# Altium schematic symbol library jlcpcb_2025_04_capacitors_extended_0805.schlib: 3281 symbols (part 5 of 18) (continued)
## AC0805KRX7R7BB104
designator C?  Capacitance: 100nF  (hidden comment: *)
Capacitor, Ceramic (MLCC), 100nF, ±10%, 16V, X7R, ±10%, SMD 0805; Manufacturer: YAGEO; Manufacturer Part Number: AC0805KRX7R7BB104; Package Size: 0805; JLCPCB Basic Part: No; JLCPCB Part Number: C2169363; Supplier 1: LCSC; Category: Capacitors - MLCC; Supplier Part Number 1: C2169363; Tolerance: ±10%; Voltage Rating: 16V; Temperature Coefficient: X7R; RoHS: Yes; ComponentLink1Description: Datasheet; ComponentLink1URL: https://wmsc.lcsc.com/wmsc/upload/file/pdf/v2/lcsc/2202040330_YAGEO-AC0805KRX7R7BB104_C2169363.pdf; ComponentLink2Description: JLCPCB Part URL; ComponentLink2URL: https://jlcpcb.com/partdetail/C2169363; ComponentLink3Description: LCSC Part URL; ComponentLink3URL: https://lcsc.com/product-detail/Multilayer-Ceramic-Capacitors-MLCC---SMD-SMT_YAGEO-YAGEO-AC0805KRX7R7BB104_C2169363.html
footprint CAP-0805 (0805 (2012M) Capacitor)
pins: 1, 2

## AC0805KRX7R7BB224
designator C?  Capacitance: 220nF  (hidden comment: *)
Capacitor, Ceramic (MLCC), 220nF, ±10%, 16V, X7R, ±10%, SMD 0805; Manufacturer: YAGEO; Manufacturer Part Number: AC0805KRX7R7BB224; Package Size: 0805; JLCPCB Basic Part: No; JLCPCB Part Number: C2173339; Supplier 1: LCSC; Category: Capacitors - MLCC; Supplier Part Number 1: C2173339; Tolerance: ±10%; Voltage Rating: 16V; Temperature Coefficient: X7R; RoHS: Yes; ComponentLink1Description: Datasheet; ComponentLink1URL: https://wmsc.lcsc.com/wmsc/upload/file/pdf/v2/lcsc/2202040630_YAGEO-AC0805KRX7R7BB224_C2173339.pdf; ComponentLink2Description: JLCPCB Part URL; ComponentLink2URL: https://jlcpcb.com/partdetail/C2173339; ComponentLink3Description: LCSC Part URL; ComponentLink3URL: https://lcsc.com/product-detail/Multilayer-Ceramic-Capacitors-MLCC---SMD-SMT_YAGEO-YAGEO-AC0805KRX7R7BB224_C2173339.html
footprint CAP-0805 (0805 (2012M) Capacitor)
pins: 1, 2

## AC0805KRX7R8BB102
designator C?  Capacitance: 1nF  (hidden comment: *)
Capacitor, Ceramic (MLCC), 1nF, ±10%, 25V, X7R, ±10%, SMD 0805; Manufacturer: YAGEO; Manufacturer Part Number: AC0805KRX7R8BB102; Package Size: 0805; JLCPCB Basic Part: No; JLCPCB Part Number: C2169184; Supplier 1: LCSC; Category: Capacitors - MLCC; Supplier Part Number 1: C2169184; Tolerance: ±10%; Voltage Rating: 25V; Temperature Coefficient: X7R; RoHS: Yes; ComponentLink1Description: Datasheet; ComponentLink1URL: https://wmsc.lcsc.com/wmsc/upload/file/pdf/v2/lcsc/2202040330_YAGEO-AC0805KRX7R8BB102_C2169184.pdf; ComponentLink2Description: JLCPCB Part URL; ComponentLink2URL: https://jlcpcb.com/partdetail/C2169184; ComponentLink3Description: LCSC Part URL; ComponentLink3URL: https://lcsc.com/product-detail/Multilayer-Ceramic-Capacitors-MLCC---SMD-SMT_YAGEO-YAGEO-AC0805KRX7R8BB102_C2169184.html
footprint CAP-0805 (0805 (2012M) Capacitor)
pins: 1, 2

## AC0805KRX7R8BB103
designator C?  Capacitance: 10nF  (hidden comment: *)
Capacitor, Ceramic (MLCC), 10nF, ±10%, 25V, X7R, ±10%, SMD 0805; Manufacturer: YAGEO; Manufacturer Part Number: AC0805KRX7R8BB103; Package Size: 0805; JLCPCB Basic Part: No; JLCPCB Part Number: C2169189; Supplier 1: LCSC; Category: Capacitors - MLCC; Supplier Part Number 1: C2169189; Tolerance: ±10%; Voltage Rating: 25V; Temperature Coefficient: X7R; RoHS: Yes; ComponentLink1Description: Datasheet; ComponentLink1URL: https://wmsc.lcsc.com/wmsc/upload/file/pdf/v2/lcsc/2202040330_YAGEO-AC0805KRX7R8BB103_C2169189.pdf; ComponentLink2Description: JLCPCB Part URL; ComponentLink2URL: https://jlcpcb.com/partdetail/C2169189; ComponentLink3Description: LCSC Part URL; ComponentLink3URL: https://lcsc.com/product-detail/Multilayer-Ceramic-Capacitors-MLCC---SMD-SMT_YAGEO-YAGEO-AC0805KRX7R8BB103_C2169189.html
footprint CAP-0805 (0805 (2012M) Capacitor)
pins: 1, 2

## AC0805KRX7R8BB104
designator C?  Capacitance: 100nF  (hidden comment: *)
Capacitor, Ceramic (MLCC), 100nF, ±10%, 25V, X7R, ±10%, SMD 0805; Manufacturer: YAGEO; Manufacturer Part Number: AC0805KRX7R8BB104; Package Size: 0805; JLCPCB Basic Part: No; JLCPCB Part Number: C726591; Supplier 1: LCSC; Category: Capacitors - MLCC; Supplier Part Number 1: C726591; Tolerance: ±10%; Voltage Rating: 25V; Temperature Coefficient: X7R; RoHS: Yes; ComponentLink1Description: Datasheet; ComponentLink1URL: https://wmsc.lcsc.com/wmsc/upload/file/pdf/v2/lcsc/2304140030_YAGEO-AC0805KRX7R8BB104_C726591.pdf; ComponentLink2Description: JLCPCB Part URL; ComponentLink2URL: https://jlcpcb.com/partdetail/C726591; ComponentLink3Description: LCSC Part URL; ComponentLink3URL: https://lcsc.com/product-detail/Multilayer-Ceramic-Capacitors-MLCC---SMD-SMT_YAGEO-YAGEO-AC0805KRX7R8BB104_C726591.html
footprint CAP-0805 (0805 (2012M) Capacitor)
pins: 1, 2

## AC0805KRX7R8BB224
designator C?  Capacitance: 220nF  (hidden comment: *)
Capacitor, Ceramic (MLCC), 220nF, ±10%, 25V, X7R, ±10%, SMD 0805; Manufacturer: YAGEO; Manufacturer Part Number: AC0805KRX7R8BB224; Package Size: 0805; JLCPCB Basic Part: No; JLCPCB Part Number: C2181254; Supplier 1: LCSC; Category: Capacitors - MLCC; Supplier Part Number 1: C2181254; Tolerance: ±10%; Voltage Rating: 25V; Temperature Coefficient: X7R; RoHS: Yes; ComponentLink1Description: Datasheet; ComponentLink1URL: https://wmsc.lcsc.com/wmsc/upload/file/pdf/v2/lcsc/2202041200_YAGEO-AC0805KRX7R8BB224_C2181254.pdf; ComponentLink2Description: JLCPCB Part URL; ComponentLink2URL: https://jlcpcb.com/partdetail/C2181254; ComponentLink3Description: LCSC Part URL; ComponentLink3URL: https://lcsc.com/product-detail/Multilayer-Ceramic-Capacitors-MLCC---SMD-SMT_YAGEO-YAGEO-AC0805KRX7R8BB224_C2181254.html
footprint CAP-0805 (0805 (2012M) Capacitor)
pins: 1, 2

## AC0805KRX7R9BB102
designator C?  Capacitance: 1nF  (hidden comment: *)
Capacitor, Ceramic (MLCC), 1nF, ±10%, 50V, X7R, ±10%, SMD 0805; Manufacturer: YAGEO; Manufacturer Part Number: AC0805KRX7R9BB102; Package Size: 0805; JLCPCB Basic Part: No; JLCPCB Part Number: C726592; Supplier 1: LCSC; Category: Capacitors - MLCC; Supplier Part Number 1: C726592; Tolerance: ±10%; Voltage Rating: 50V; Temperature Coefficient: X7R; RoHS: Yes; ComponentLink1Description: Datasheet; ComponentLink1URL: https://wmsc.lcsc.com/wmsc/upload/file/pdf/v2/lcsc/2304140030_YAGEO-AC0805KRX7R9BB102_C726592.pdf; ComponentLink2Description: JLCPCB Part URL; ComponentLink2URL: https://jlcpcb.com/partdetail/C726592; ComponentLink3Description: LCSC Part URL; ComponentLink3URL: https://lcsc.com/product-detail/Multilayer-Ceramic-Capacitors-MLCC---SMD-SMT_YAGEO-YAGEO-AC0805KRX7R9BB102_C726592.html
footprint CAP-0805 (0805 (2012M) Capacitor)
pins: 1, 2

## AC0805KRX7R9BB103
designator C?  Capacitance: 10nF  (hidden comment: *)
Capacitor, Ceramic (MLCC), 10nF, ±10%, 50V, X7R, ±10%, SMD 0805; Manufacturer: YAGEO; Manufacturer Part Number: AC0805KRX7R9BB103; Package Size: 0805; JLCPCB Basic Part: No; JLCPCB Part Number: C326835; Supplier 1: LCSC; Category: Capacitors - MLCC; Supplier Part Number 1: C326835; Tolerance: ±10%; Voltage Rating: 50V; Temperature Coefficient: X7R; RoHS: Yes; ComponentLink1Description: Datasheet; ComponentLink1URL: https://wmsc.lcsc.com/wmsc/upload/file/pdf/v2/lcsc/1811141226_YAGEO-AC0805KRX7R9BB103_C326835.pdf; ComponentLink2Description: JLCPCB Part URL; ComponentLink2URL: https://jlcpcb.com/partdetail/C326835; ComponentLink3Description: LCSC Part URL; ComponentLink3URL: https://lcsc.com/product-detail/Multilayer-Ceramic-Capacitors-MLCC---SMD-SMT_YAGEO-YAGEO-AC0805KRX7R9BB103_C326835.html
footprint CAP-0805 (0805 (2012M) Capacitor)
pins: 1, 2

## AC0805KRX7R9BB104
designator C?  Capacitance: 100nF  (hidden comment: *)
Capacitor, Ceramic (MLCC), 100nF, ±10%, 50V, X7R, ±10%, SMD 0805; Manufacturer: YAGEO; Manufacturer Part Number: AC0805KRX7R9BB104; Package Size: 0805; JLCPCB Basic Part: No; JLCPCB Part Number: C277502; Supplier 1: LCSC; Category: Capacitors - MLCC; Supplier Part Number 1: C277502; Tolerance: ±10%; Voltage Rating: 50V; Temperature Coefficient: X7R; RoHS: Yes; ComponentLink1Description: Datasheet; ComponentLink1URL: https://wmsc.lcsc.com/wmsc/upload/file/pdf/v2/lcsc/2304140030_YAGEO-AC0805KRX7R9BB104_C277502.pdf; ComponentLink2Description: JLCPCB Part URL; ComponentLink2URL: https://jlcpcb.com/partdetail/C277502; ComponentLink3Description: LCSC Part URL; ComponentLink3URL: https://lcsc.com/product-detail/Multilayer-Ceramic-Capacitors-MLCC---SMD-SMT_YAGEO-YAGEO-AC0805KRX7R9BB104_C277502.html
footprint CAP-0805 (0805 (2012M) Capacitor)
pins: 1, 2

## AC0805KRX7R9BB152
designator C?  Capacitance: 1.5nF  (hidden comment: *)
Capacitor, Ceramic (MLCC), 1.5nF, ±10%, 50V, X7R, ±10%, SMD 0805; Manufacturer: YAGEO; Manufacturer Part Number: AC0805KRX7R9BB152; Package Size: 0805; JLCPCB Basic Part: No; JLCPCB Part Number: C726593; Supplier 1: LCSC; Category: Capacitors - MLCC; Supplier Part Number 1: C726593; Tolerance: ±10%; Voltage Rating: 50V; Temperature Coefficient: X7R; RoHS: Yes; ComponentLink1Description: Datasheet; ComponentLink1URL: https://wmsc.lcsc.com/wmsc/upload/file/pdf/v2/lcsc/2304140030_YAGEO-AC0805KRX7R9BB152_C726593.pdf; ComponentLink2Description: JLCPCB Part URL; ComponentLink2URL: https://jlcpcb.com/partdetail/C726593; ComponentLink3Description: LCSC Part URL; ComponentLink3URL: https://lcsc.com/product-detail/Multilayer-Ceramic-Capacitors-MLCC---SMD-SMT_YAGEO-YAGEO-AC0805KRX7R9BB152_C726593.html
footprint CAP-0805 (0805 (2012M) Capacitor)
pins: 1, 2

## AC0805KRX7R9BB222
designator C?  Capacitance: 2.2nF  (hidden comment: *)
Capacitor, Ceramic (MLCC), 2.2nF, ±10%, 50V, X7R, ±10%, SMD 0805; Manufacturer: YAGEO; Manufacturer Part Number: AC0805KRX7R9BB222; Package Size: 0805; JLCPCB Basic Part: No; JLCPCB Part Number: C723475; Supplier 1: LCSC; Category: Capacitors - MLCC; Supplier Part Number 1: C723475; Tolerance: ±10%; Voltage Rating: 50V; Temperature Coefficient: X7R; RoHS: Yes; ComponentLink1Description: Datasheet; ComponentLink1URL: https://wmsc.lcsc.com/wmsc/upload/file/pdf/v2/lcsc/2008171812_YAGEO-AC0805KRX7R9BB222_C723475.pdf; ComponentLink2Description: JLCPCB Part URL; ComponentLink2URL: https://jlcpcb.com/partdetail/C723475; ComponentLink3Description: LCSC Part URL; ComponentLink3URL: https://lcsc.com/product-detail/Multilayer-Ceramic-Capacitors-MLCC---SMD-SMT_YAGEO-YAGEO-AC0805KRX7R9BB222_C723475.html
footprint CAP-0805 (0805 (2012M) Capacitor)
pins: 1, 2

## AC0805KRX7R9BB332
designator C?  Capacitance: 3.3nF  (hidden comment: *)
Capacitor, Ceramic (MLCC), 3.3nF, ±10%, 50V, X7R, ±10%, SMD 0805; Manufacturer: YAGEO; Manufacturer Part Number: AC0805KRX7R9BB332; Package Size: 0805; JLCPCB Basic Part: No; JLCPCB Part Number: C2199569; Supplier 1: LCSC; Category: Capacitors - MLCC; Supplier Part Number 1: C2199569; Tolerance: ±10%; Voltage Rating: 50V; Temperature Coefficient: X7R; RoHS: Yes; ComponentLink1Description: Datasheet; ComponentLink1URL: https://wmsc.lcsc.com/wmsc/upload/file/pdf/v2/lcsc/2304140030_YAGEO-AC0805KRX7R9BB332_C2199569.pdf; ComponentLink2Description: JLCPCB Part URL; ComponentLink2URL: https://jlcpcb.com/partdetail/C2199569; ComponentLink3Description: LCSC Part URL; ComponentLink3URL: https://lcsc.com/product-detail/Multilayer-Ceramic-Capacitors-MLCC---SMD-SMT_YAGEO-YAGEO-AC0805KRX7R9BB332_C2199569.html
footprint CAP-0805 (0805 (2012M) Capacitor)
pins: 1, 2

## AC0805KRX7R9BB472
designator C?  Capacitance: 4.7nF  (hidden comment: *)
Capacitor, Ceramic (MLCC), 4.7nF, ±10%, 50V, X7R, ±10%, SMD 0805; Manufacturer: YAGEO; Manufacturer Part Number: AC0805KRX7R9BB472; Package Size: 0805; JLCPCB Basic Part: No; JLCPCB Part Number: C726596; Supplier 1: LCSC; Category: Capacitors - MLCC; Supplier Part Number 1: C726596; Tolerance: ±10%; Voltage Rating: 50V; Temperature Coefficient: X7R; RoHS: Yes; ComponentLink1Description: Datasheet; ComponentLink1URL: https://wmsc.lcsc.com/wmsc/upload/file/pdf/v2/lcsc/2304140030_YAGEO-AC0805KRX7R9BB472_C726596.pdf; ComponentLink2Description: JLCPCB Part URL; ComponentLink2URL: https://jlcpcb.com/partdetail/C726596; ComponentLink3Description: LCSC Part URL; ComponentLink3URL: https://lcsc.com/product-detail/Multilayer-Ceramic-Capacitors-MLCC---SMD-SMT_YAGEO-YAGEO-AC0805KRX7R9BB472_C726596.html
footprint CAP-0805 (0805 (2012M) Capacitor)
pins: 1, 2

## AC0805KRX7R9BB473
designator C?  Capacitance: 47nF  (hidden comment: *)
Capacitor, Ceramic (MLCC), 47nF, ±10%, 50V, X7R, ±10%, SMD 0805; Manufacturer: YAGEO; Manufacturer Part Number: AC0805KRX7R9BB473; Package Size: 0805; JLCPCB Basic Part: No; JLCPCB Part Number: C149607; Supplier 1: LCSC; Category: Capacitors - MLCC; Supplier Part Number 1: C149607; Tolerance: ±10%; Voltage Rating: 50V; Temperature Coefficient: X7R; RoHS: Yes; ComponentLink1Description: Datasheet; ComponentLink1URL: https://wmsc.lcsc.com/wmsc/upload/file/pdf/v2/lcsc/2304140030_YAGEO-AC0805KRX7R9BB473_C149607.pdf; ComponentLink2Description: JLCPCB Part URL; ComponentLink2URL: https://jlcpcb.com/partdetail/C149607; ComponentLink3Description: LCSC Part URL; ComponentLink3URL: https://lcsc.com/product-detail/Multilayer-Ceramic-Capacitors-MLCC---SMD-SMT_YAGEO-YAGEO-AC0805KRX7R9BB473_C149607.html
footprint CAP-0805 (0805 (2012M) Capacitor)
pins: 1, 2

## AC0805KRX7R9BB682
designator C?  Capacitance: 6.8nF  (hidden comment: *)
Capacitor, Ceramic (MLCC), 6.8nF, ±10%, 50V, X7R, ±10%, SMD 0805; Manufacturer: YAGEO; Manufacturer Part Number: AC0805KRX7R9BB682; Package Size: 0805; JLCPCB Basic Part: No; JLCPCB Part Number: C726597; Supplier 1: LCSC; Category: Capacitors - MLCC; Supplier Part Number 1: C726597; Tolerance: ±10%; Voltage Rating: 50V; Temperature Coefficient: X7R; RoHS: Yes; ComponentLink1Description: Datasheet; ComponentLink1URL: https://wmsc.lcsc.com/wmsc/upload/file/pdf/v2/lcsc/2304140030_YAGEO-AC0805KRX7R9BB682_C726597.pdf; ComponentLink2Description: JLCPCB Part URL; ComponentLink2URL: https://jlcpcb.com/partdetail/C726597; ComponentLink3Description: LCSC Part URL; ComponentLink3URL: https://lcsc.com/product-detail/Multilayer-Ceramic-Capacitors-MLCC---SMD-SMT_YAGEO-YAGEO-AC0805KRX7R9BB682_C726597.html
footprint CAP-0805 (0805 (2012M) Capacitor)
pins: 1, 2

## AC0805KRX7RBBB222
designator C?  Capacitance: 2.2nF  (hidden comment: *)
Capacitor, Ceramic (MLCC), 2.2nF, ±10%, 500V, X7R, ±10%, SMD 0805; Manufacturer: YAGEO; Manufacturer Part Number: AC0805KRX7RBBB222; Package Size: 0805; JLCPCB Basic Part: No; JLCPCB Part Number: C2178633; Supplier 1: LCSC; Category: Capacitors - MLCC; Supplier Part Number 1: C2178633; Tolerance: ±10%; Voltage Rating: 500V; Temperature Coefficient: X7R; RoHS: Yes; ComponentLink1Description: Datasheet; ComponentLink1URL: https://wmsc.lcsc.com/wmsc/upload/file/pdf/v2/lcsc/2202041000_YAGEO-AC0805KRX7RBBB222_C2178633.pdf; ComponentLink2Description: JLCPCB Part URL; ComponentLink2URL: https://jlcpcb.com/partdetail/C2178633; ComponentLink3Description: LCSC Part URL; ComponentLink3URL: https://lcsc.com/product-detail/Multilayer-Ceramic-Capacitors-MLCC---SMD-SMT_YAGEO-YAGEO-AC0805KRX7RBBB222_C2178633.html
footprint CAP-0805 (0805 (2012M) Capacitor)
pins: 1, 2

## AC0805KRX7RBBB472
designator C?  Capacitance: 4.7nF  (hidden comment: *)
Capacitor, Ceramic (MLCC), 4.7nF, ±10%, 500V, X7R, ±10%, SMD 0805; Manufacturer: YAGEO; Manufacturer Part Number: AC0805KRX7RBBB472; Package Size: 0805; JLCPCB Basic Part: No; JLCPCB Part Number: C2182865; Supplier 1: LCSC; Category: Capacitors - MLCC; Supplier Part Number 1: C2182865; Tolerance: ±10%; Voltage Rating: 500V; Temperature Coefficient: X7R; RoHS: Yes; ComponentLink1Description: Datasheet; ComponentLink1URL: https://wmsc.lcsc.com/wmsc/upload/file/pdf/v2/lcsc/2202041300_YAGEO-AC0805KRX7RBBB472_C2182865.pdf; ComponentLink2Description: JLCPCB Part URL; ComponentLink2URL: https://jlcpcb.com/partdetail/C2182865; ComponentLink3Description: LCSC Part URL; ComponentLink3URL: https://lcsc.com/product-detail/Multilayer-Ceramic-Capacitors-MLCC---SMD-SMT_YAGEO-YAGEO-AC0805KRX7RBBB472_C2182865.html
footprint CAP-0805 (0805 (2012M) Capacitor)
pins: 1, 2

## AC0805KRX7RYBB102
designator C?  Capacitance: 1nF  (hidden comment: *)
Capacitor, Ceramic (MLCC), 1nF, ±10%, 250V, X7R, ±10%, SMD 0805; Manufacturer: YAGEO; Manufacturer Part Number: AC0805KRX7RYBB102; Package Size: 0805; JLCPCB Basic Part: No; JLCPCB Part Number: C726599; Supplier 1: LCSC; Category: Capacitors - MLCC; Supplier Part Number 1: C726599; Tolerance: ±10%; Voltage Rating: 250V; Temperature Coefficient: X7R; RoHS: Yes; ComponentLink1Description: Datasheet; ComponentLink1URL: https://wmsc.lcsc.com/wmsc/upload/file/pdf/v2/lcsc/2304140030_YAGEO-AC0805KRX7RYBB102_C726599.pdf; ComponentLink2Description: JLCPCB Part URL; ComponentLink2URL: https://jlcpcb.com/partdetail/C726599; ComponentLink3Description: LCSC Part URL; ComponentLink3URL: https://lcsc.com/product-detail/Multilayer-Ceramic-Capacitors-MLCC---SMD-SMT_YAGEO-YAGEO-AC0805KRX7RYBB102_C726599.html
footprint CAP-0805 (0805 (2012M) Capacitor)
pins: 1, 2

## AMK212ABJ226MGHT
designator C?  Capacitance: 22uF  (hidden comment: *)
Capacitor, Ceramic (MLCC), 22uF, ±20%, 4V, ±20%, SMD 0805; Manufacturer: Taiyo Yuden; Manufacturer Part Number: AMK212ABJ226MGHT; Package Size: 0805; JLCPCB Basic Part: No; JLCPCB Part Number: C454074; Supplier 1: LCSC; Category: Capacitors - MLCC; Supplier Part Number 1: C454074; Tolerance: ±20%; Voltage Rating: 4V; RoHS: Yes; ComponentLink1Description: Datasheet; ComponentLink1URL: https://wmsc.lcsc.com/wmsc/upload/file/pdf/v2/lcsc/2004161032_Taiyo-Yuden-AMK212ABJ226MGHT_C454074.pdf; ComponentLink2Description: JLCPCB Part URL; ComponentLink2URL: https://jlcpcb.com/partdetail/C454074; ComponentLink3Description: LCSC Part URL; ComponentLink3URL: https://lcsc.com/product-detail/Multilayer-Ceramic-Capacitors-MLCC---SMD-SMT_Taiyo-Yuden-Taiyo-Yuden-AMK212ABJ226MGHT_C454074.html
footprint CAP-0805 (0805 (2012M) Capacitor)
pins: 1, 2

## AMK212BBJ107MG-T
designator C?  Capacitance: 100uF  (hidden comment: *)
Capacitor, Ceramic (MLCC), 100uF, ±20%, 4V, X5R, ±20%, SMD 0805; Manufacturer: Taiyo Yuden; Manufacturer Part Number: AMK212BBJ107MG-T; Package Size: 0805; JLCPCB Basic Part: No; JLCPCB Part Number: C3835503; Supplier 1: LCSC; Category: Capacitors - MLCC; Supplier Part Number 1: C3835503; Tolerance: ±20%; Voltage Rating: 4V; Temperature Coefficient: X5R; RoHS: Yes; ComponentLink1Description: Datasheet; ComponentLink1URL: https://wmsc.lcsc.com/wmsc/upload/file/pdf/v2/lcsc/2309041604_Taiyo-Yuden-AMK212BBJ107MG-T_C3835503.pdf; ComponentLink2Description: JLCPCB Part URL; ComponentLink2URL: https://jlcpcb.com/partdetail/C3835503; ComponentLink3Description: LCSC Part URL; ComponentLink3URL: https://lcsc.com/product-detail/Multilayer-Ceramic-Capacitors-MLCC---SMD-SMT_Taiyo-Yuden-Taiyo-Yuden-AMK212BBJ107MG-T_C3835503.html
footprint CAP-0805 (0805 (2012M) Capacitor)
pins: 1, 2

## AMK212BBJ476MD-T
designator C?  Capacitance: 47uF  (hidden comment: *)
Capacitor, Ceramic (MLCC), 47uF, ±20%, 4V, X5R, ±20%, SMD 0805; Manufacturer: Taiyo Yuden; Manufacturer Part Number: AMK212BBJ476MD-T; Package Size: 0805; JLCPCB Basic Part: No; JLCPCB Part Number: C412621; Supplier 1: LCSC; Category: Capacitors - MLCC; Supplier Part Number 1: C412621; Tolerance: ±20%; Voltage Rating: 4V; Temperature Coefficient: X5R; RoHS: Yes; ComponentLink1Description: Datasheet; ComponentLink1URL: https://wmsc.lcsc.com/wmsc/upload/file/pdf/v2/lcsc/2006241533_Taiyo-Yuden-AMK212BBJ476MD-T_C412621.pdf; ComponentLink2Description: JLCPCB Part URL; ComponentLink2URL: https://jlcpcb.com/partdetail/C412621; ComponentLink3Description: LCSC Part URL; ComponentLink3URL: https://lcsc.com/product-detail/Multilayer-Ceramic-Capacitors-MLCC---SMD-SMT_Taiyo-Yuden-Taiyo-Yuden-AMK212BBJ476MD-T_C412621.html
footprint CAP-0805 (0805 (2012M) Capacitor)
pins: 1, 2

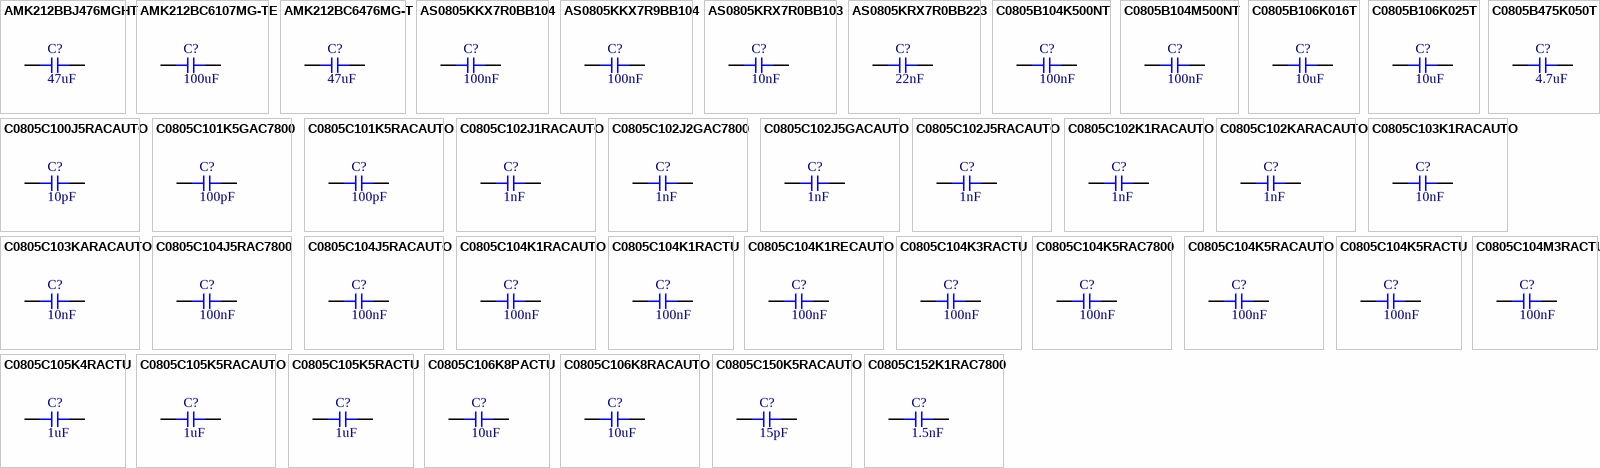
[diagram p22: symbols AMK212BBJ476MGHT to C0805C152K1RAC7800]

## AMK212BBJ476MGHT
designator C?  Capacitance: 47uF  (hidden comment: *)
Capacitor, Ceramic (MLCC), 47uF, ±20%, 4V, X5R, ±20%, SMD 0805; Manufacturer: Taiyo Yuden; Manufacturer Part Number: AMK212BBJ476MGHT; Package Size: 0805; JLCPCB Basic Part: No; JLCPCB Part Number: C650954; Supplier 1: LCSC; Category: Capacitors - MLCC; Supplier Part Number 1: C650954; Tolerance: ±20%; Voltage Rating: 4V; Temperature Coefficient: X5R; RoHS: Yes; ComponentLink1Description: Datasheet; ComponentLink1URL: https://wmsc.lcsc.com/wmsc/upload/file/pdf/v2/lcsc/2304140030_Taiyo-Yuden-AMK212BBJ476MGHT_C650954.pdf; ComponentLink2Description: JLCPCB Part URL; ComponentLink2URL: https://jlcpcb.com/partdetail/C650954; ComponentLink3Description: LCSC Part URL; ComponentLink3URL: https://lcsc.com/product-detail/Multilayer-Ceramic-Capacitors-MLCC---SMD-SMT_Taiyo-Yuden-Taiyo-Yuden-AMK212BBJ476MGHT_C650954.html
footprint CAP-0805 (0805 (2012M) Capacitor)
pins: 1, 2

## AMK212BC6107MG-TE
designator C?  Capacitance: 100uF  (hidden comment: *)
Capacitor, Ceramic (MLCC), 100uF, ±20%, 4V, X6S, ±20%, SMD 0805; Manufacturer: Taiyo Yuden; Manufacturer Part Number: AMK212BC6107MG-TE; Package Size: 0805; JLCPCB Basic Part: No; JLCPCB Part Number: C1864463; Supplier 1: LCSC; Category: Capacitors - MLCC; Supplier Part Number 1: C1864463; Tolerance: ±20%; Voltage Rating: 4V; Temperature Coefficient: X6S; RoHS: Yes; ComponentLink1Description: Datasheet; ComponentLink1URL: https://wmsc.lcsc.com/wmsc/upload/file/pdf/v2/lcsc/2207011830_Taiyo-Yuden-AMK212BC6107MG-TE_C1864463.pdf; ComponentLink2Description: JLCPCB Part URL; ComponentLink2URL: https://jlcpcb.com/partdetail/C1864463; ComponentLink3Description: LCSC Part URL; ComponentLink3URL: https://lcsc.com/product-detail/Multilayer-Ceramic-Capacitors-MLCC---SMD-SMT_Taiyo-Yuden-Taiyo-Yuden-AMK212BC6107MG-TE_C1864463.html
footprint CAP-0805 (0805 (2012M) Capacitor)
pins: 1, 2

## AMK212BC6476MG-T
designator C?  Capacitance: 47uF  (hidden comment: *)
Capacitor, Ceramic (MLCC), 47uF, ±20%, 4V, X6S, ±20%, SMD 0805; Manufacturer: Taiyo Yuden; Manufacturer Part Number: AMK212BC6476MG-T; Package Size: 0805; JLCPCB Basic Part: No; JLCPCB Part Number: C697609; Supplier 1: LCSC; Category: Capacitors - MLCC; Supplier Part Number 1: C697609; Tolerance: ±20%; Voltage Rating: 4V; Temperature Coefficient: X6S; RoHS: Yes; ComponentLink1Description: Datasheet; ComponentLink1URL: https://wmsc.lcsc.com/wmsc/upload/file/pdf/v2/lcsc/2211282200_Taiyo-Yuden-AMK212BC6476MG-T_C697609.pdf; ComponentLink2Description: JLCPCB Part URL; ComponentLink2URL: https://jlcpcb.com/partdetail/C697609; ComponentLink3Description: LCSC Part URL; ComponentLink3URL: https://lcsc.com/product-detail/Multilayer-Ceramic-Capacitors-MLCC---SMD-SMT_Taiyo-Yuden-Taiyo-Yuden-AMK212BC6476MG-T_C697609.html
footprint CAP-0805 (0805 (2012M) Capacitor)
pins: 1, 2
